# Altium integrated library Integrated_Library - 02.02.25 - 22.49.IntLib: 792 symbols (part 7 of 11)
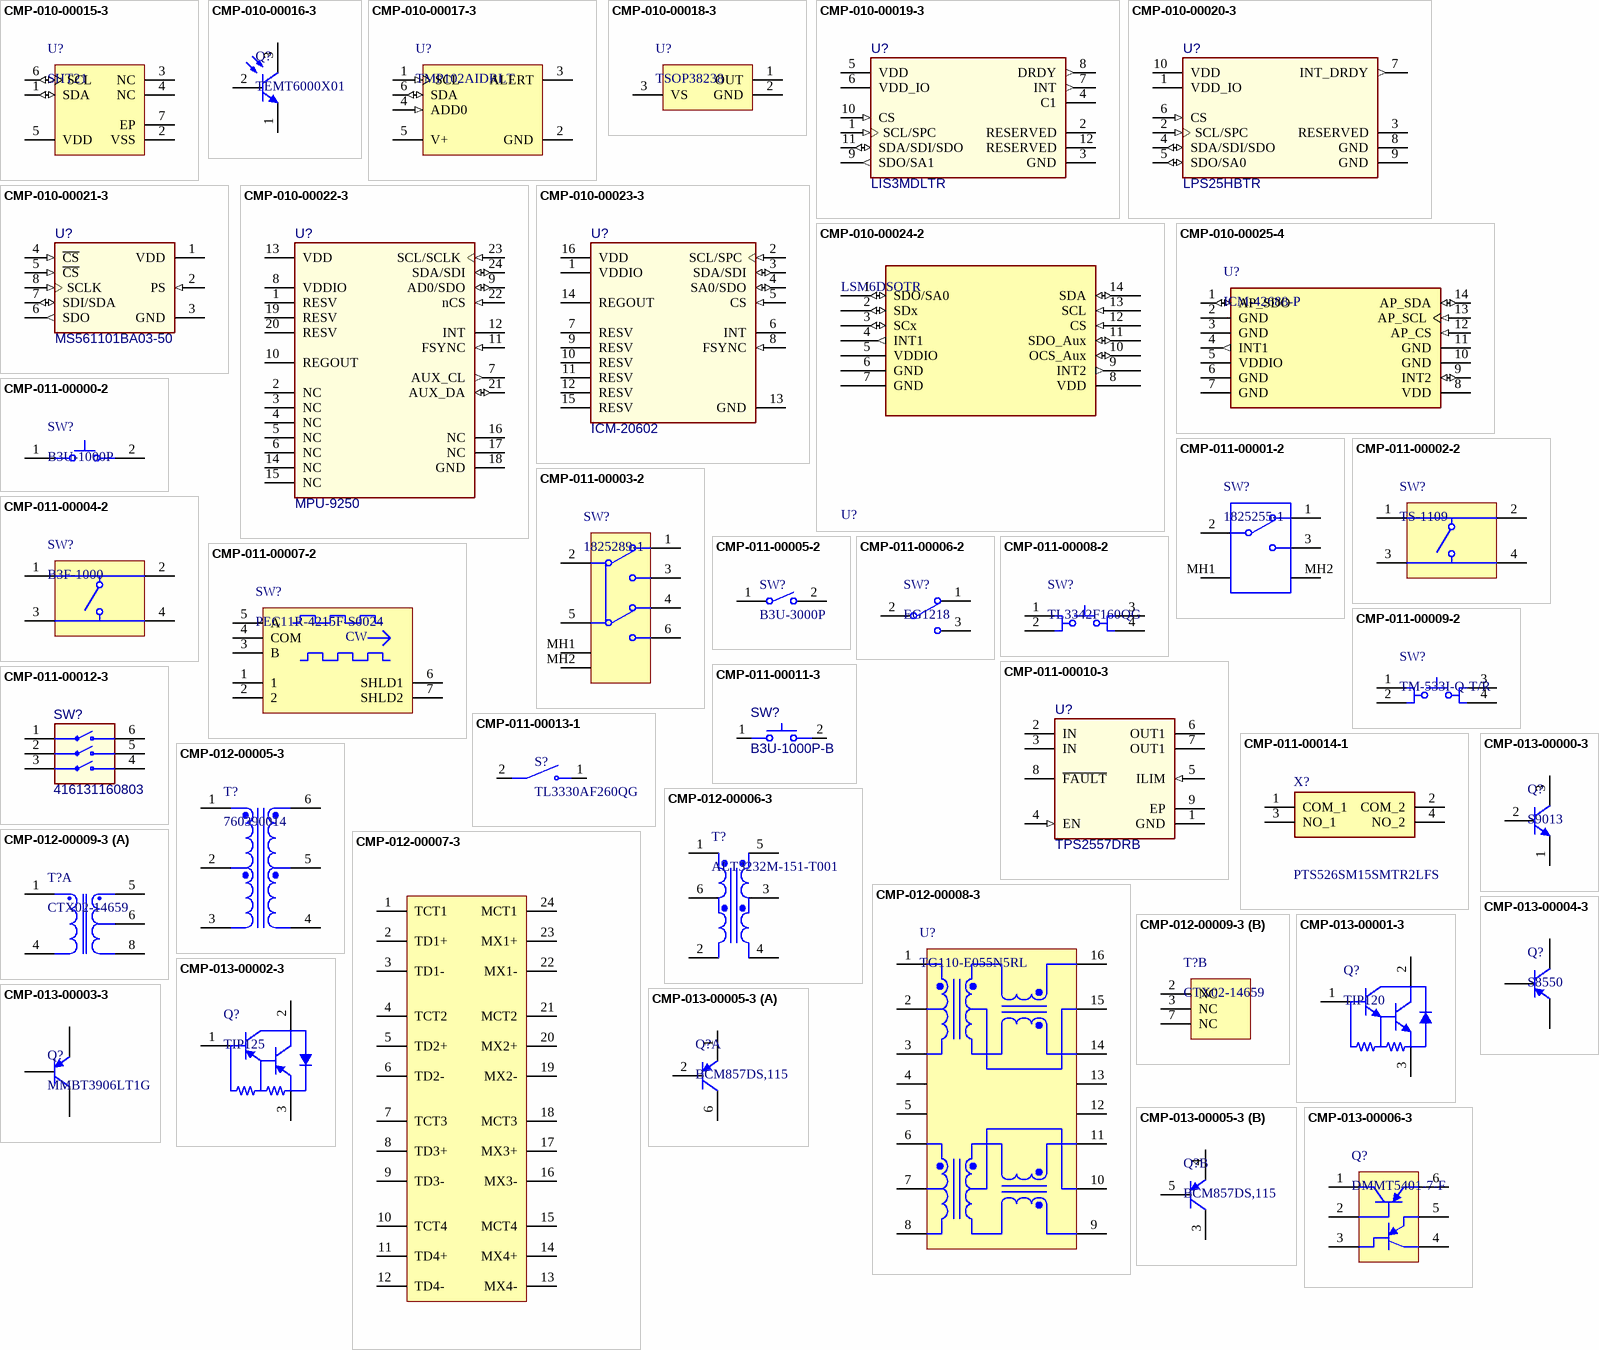
[diagram p32: symbols CMP-010-00015-3 to CMP-013-00006-3]

## CMP-010-00022-3
designator U?, comment MPU-9250
9-axis MotionTracking device, 2.4 to 3,6 V, -40 to 85 degC, 24-Pin QFN, RoHS, Tape and Reel; Min Supply Voltage: 2.4V; Max Supply Voltage: 3.6V; Sensor Type: Accelerometer,Gyroscope,Magnetometer; Pins: 24; Max Operating Temperature: 85°C; Min Operating Temperature: -40°C; Mounting Technology: SMT; Case/Package: QFN
footprint INSE-QFN-24-1700X1540TP_N (QFN, 24-Leads, Body 3.1x3.1mm, Pitch 0.40mm, Thermal Pad 1.54x1.70mm, IPC Medium Density)
footprint INSE-QFN-24-1700X1540TP_N-40 (QFN, 24-Leads, Body 3.1x3.1mm, Pitch 0.40mm, Thermal Pad 1.54x1.70mm, IPC Medium Density)
pins: 1 RESV (power) "Reserved. Connect to VDDIO", 2 NC "Not internally connected. May be used for PCB trace routing", 3 NC "Not internally connected. May be used for PCB trace routing", 4 NC "Not internally connected. May be used for PCB trace routing", 5 NC "Not internally connected. May be used for PCB trace routing", 6 NC "Not internally connected. May be used for PCB trace routing", 7 AUX_CL (out) "I2C Master serial clock, for connecting to external sensors", 8 VDDIO (power) "Digital I/O supply voltage", 9 AD0/SDO (io) "I2C Slave Address LSB (AD0); SPI serial data output (SDO)", 10 REGOUT "Regulator filter capacitor connection", 11 FSYNC (in) "Frame synchronization digital input. Connect to GND if unused", 12 INT (hiz) "Interrupt digital output (totem pole or open-drain)", 13 VDD (power) "Power supply voltage and Digital I/O supply voltage", 14 NC "Not internally connected. May be used for PCB trace routing", 15 NC "Not internally connected. May be used for PCB trace routing", 16 NC "Not internally connected. May be used for PCB trace routing", 17 NC "Not internally connected. May be used for PCB trace routing", 18 GND (power) "Pow er supply ground", 19 RESV "Reserved. Do not connect", 20 RESV (power) "Reserved. Connect to GND", 21 AUX_DA (io) "I2C master serial data, for connecting to external sensors", 22 nCS (in) "Chip select (SPI mode only)", 23 SCL/SCLK (in) "I2C serial clock (SCL); SPI serial clock (SCLK)", 24 SDA/SDI (io) "I2C serial data (SDA); SPI serial data input (SDI)"

## CMP-010-00023-3
designator U?, comment ICM-20602
High Performance 6-Axis MEMS MotionTracking(TM) Device, 1.71 to 3.45 V, -40 to 85 degC, 16-Pin LGA, RoHS; Max Supply Voltage: 3.45V; Sensor Type: 6 Axis,Accelerometer,Gyroscope,Temperature; Min Supply Voltage: 1.71V; Mounting Technology: SMT; Max Operating Temperature: 85°C; Min Operating Temperature: -40°C; Pins: 16; Case/Package: LGA-16; RoHS Compliant: Yes
footprint INSE-I62-16 (LGA, 16-Leads, Body 3x3mm, Pitch 0.5mm)
footprint INSE-I62-16 (LGA, 16-Leads, Body 3x3mm, Pitch 0.5mm)
pins: 1 VDDIO (power) "Digital I/O supply voltage", 2 SCL/SPC (in) "I2C serial clock (SCL); SPI serial clock (SPC)", 3 SDA/SDI (io) "I2C serial data (SDA); SPI serial data input (SDI)", 4 SA0/SDO (io) "I2C slave address LSB (SA0); SPI serial data output (SDO)", 5 CS (in) "Chip select (0 = SPI mode; 1 = I2C mode)", 6 INT (oc) "Interrupt digital output (totem pole or open-drain)", 7 RESV "Reserved. Do not connect.", 8 FSYNC (in) "Synchronization digital input (optional). Connect to GND if unused.", 9 RESV "Reserved. Connect to GND.", 10 RESV "Reserved. Connect to GND.", 11 RESV "Reserved. Connect to GND.", 12 RESV "Reserved. Connect to GND.", 13 GND (power) "Connect to GND", 14 REGOUT "Regulator filter capacitor connection", 15 RESV "Reserved. Connect to GND.", 16 VDD (power) "Power Supply"

## CMP-010-00024-2
designator U?, comment LSM6DSOTR
Analog Circuit, 1 Func, CMOS, PBGA14; Reach SVHC Compliant: Yes; Throw Configuration: ANALOG CIRCUIT; RoHS Compliant: Yes
footprint FP-LGA-14L-DM00249496-MFG
pins: 1 SDO/SA0 (io), 2 SDx (io), 3 SCx (io), 4 INT1 (out), 5 VDDIO (power), 6 GND (power), 7 GND (power), 8 VDD (power), 9 INT2 (out), 10 OCS_Aux (io), 11 SDO_Aux (io), 12 CS (in), 13 SCL (in), 14 SDA (io)

## CMP-010-00025-4
designator U?, comment ICM-42688-P
Accelerometer, Gyroscope, 6 Axis Sensor Output; Value: *; Availability: Unavailable; Pins: 14; Design Item ID: ICM-42688-P; MP: ICM-42688-P; Case/Package: None; Source: ICM-42688-P.SchLib; Component Type: Standard; Price: None
footprint PQFN50P300X250X97-14N
footprint PQFN50P300X250X97-14N
pins: 1 AP_SDO (io), 2 GND (power), 3 GND (power), 4 INT1 (out), 5 VDDIO (power), 6 GND (power), 7 GND (power), 8 VDD (power), 9 INT2 (io), 10 GND (power), 11 GND (power), 12 AP_CS (in), 13 AP_SCL (in), 14 AP_SDA (io)

## CMP-011-00000-2
designator SW?, comment B3U-1000P
Tactile Switch, SPST-NO, 0.05 A, 12 V, -25 to 70 degC, 2-Pin SMD, RoHS, Tape and Reel; Manufacturer: Omron Electronic Components; IP Rating: IP40; Current Rating: 50mA; Max Contact Resistance: 100mohm; Operating Force: 153gf; Throw Configuration: SPST; Resistance: 0.1Ohm; Max Voltage Rating (DC): 12V; Contact Material: Silver; Max Current Rating: 50mA; Datasheet URL: http://www.omron.com/ecb/products/pdf/en-b3u.pdf; Mounting Technology: SM; Case/Package: B3U-1000; Packaging: TapeandReel; Package Reference: B3U-1000; Manufacturer URL: http://www.omron.com/; Datasheet Version: Jan-15; RoHS Compliant: True; Max Operating Temperature: 70°C; Contact Current Rating: 50mA; Package Quantity: 3500; Package Description: 2-Pin Surface Mount Device, Body 3 x 2.5 mm; Voltage Rating (DC): 12V; Min Operating Temperature: -25°C; Voltage Rating: 12V
footprint OMRON-B3U-1000_V (SMD, 2-Leads, Body 3x2.5mm)
pins: 1, 2

## CMP-011-00001-2
designator SW?, comment 1825255-1
Slide Switch, SPDT, 0.3A, 125 V, -20 to 85 degC, 5-Pin THD, RoHS, Tray; Manufacturer: TE Connectivity; Current Rating: 300mA; Voltage Rating (AC): 125V; Max Contact Resistance: 30mohm; Operating Force: 600gf; Manufacturer URL: http://www.te.com/; Max Current Rating: 300mA; Contact Plating: Silver; Contact Material: Copper; Datasheet URL: http://www.te.com/commerce/DocumentDelivery/DDEController?Action=showdoc&DocId=Customer+Drawing%7F1825255%7FA4%7Fpdf%7FEnglish%7FENG_CD_1825255_A4_baseFilename.pdf%7F1825255-1; Throw Configuration: SPDT; Packaging: Bulk; Package Quantity: 560; Max Voltage Rating (AC): 125V; Mounting Technology: TH; RoHS Compliant: True; Case/Package: 1825255-1; Datasheet Version: Rev. A4, 03/2014; Contact Finish: Silver; Package Reference: 1825255-1; Package Description: 5-Pin Through Hole Device, Body 6.7 x 16 mm, Pitch 4 mm; Min Operating Temperature: -20°C; Max Operating Temperature: 85°C
footprint TECO-1825255-1_V (THD, 5-Leads, Body 6.7x16mm, Pitch 4mm)
pins: 1, 2, 3, MH1, MH2

## CMP-011-00002-2
designator SW?, comment TS-1109
Tactile Switch, SPST, 12 V, 50 mA, -20 to 80 degC, 4-Pin THD; Manufacturer: Shenzhen Best; RoHS Compliant: Unknown; Manufacturer URL: www.best-dz.com/; Case/Package: TS-1109; Package Reference: TS-1109; Datasheet Version: Dec-12; Mounting Technology: TH; Package Description: 4-Pin Through Hole Device, Body 6.2 x 6.2 mm; Datasheet URL: http://datasheet.octopart.com/TS-1109-Best-Inc.-datasheet-30458100.pdf
footprint BEST-TS-1109_V (THD, 4-Leads, Body 6.2x6.2mm)
pins: 1, 2, 3, 4

## CMP-011-00003-2
designator SW?, comment 1825289-1
Slide Switch, DPDT, 0.3A, 125 V, -20 to 85 degC, 6-Pin THD, RoHS, Bulk; Manufacturer: TE Connectivity; Max Contact Resistance: 30mohm; Operating Force: 600gf; Voltage Rating (AC): 125V; Max Current Rating: 300mA; Throw Configuration: DPDT; Mounting Technology: TH; Manufacturer URL: http://www.te.com/; Contact Plating: Silver; Datasheet Version: Mar-08; Max Operating Temperature: 85°C; Contact Finish: Silver; Package Reference: 1825289-1; Package Quantity: 560; Min Operating Temperature: -20°C; Max Voltage Rating (AC): 125V; RoHS Compliant: True; Package Description: 6-Pin Through Hole Device, Body 16 x 6.7 mm, Height 12.05 mm; Current Rating: 300mA; Packaging: Bulk; Case/Package: 1825289-1; Contact Material: Copper; Package URL: http://www.te.com/commerce/DocumentDelivery/DDEController?Action=showdoc&DocId=Customer+Drawing%7F1825289%7FB3%7Fpdf%7FEnglish%7FENG_CD_1825289_B3.pdf%7F1825289-1; Datasheet URL: http://www.te.com/commerce/DocumentDelivery/DDEController?Action=showdoc&DocId=Catalog+Section%7F1308111-1_SWITCHES_CORE_PROGRAM_CATALOG%7F0308%7Fpdf%7FEnglish%7FENG_CS_1308111-1_SWITCHES_CORE_PROGRAM_CATALOG_0308.pdf%7F1825289-1
footprint TE-1825289-1_V (TH, 6-Leads, Body 16.05x6.75mm)
pins: 1, 2, 3, 4, 5, 6, MH1, MH2

## CMP-011-00004-2
designator SW?, comment B3F-1000
Tactile Switch, SPST-NO, 0.05 A, 24 V, -25 to 70 degC, 4-Pin THD, RoHS, Bulk; Manufacturer: Omron Electronic Components; Throw Configuration: SPST; Max Contact Resistance: 100mohm; Resistance: 0.1Ohm; Max Current Rating: 50mA; Voltage Rating: 24V; Operating Force: 100gf; Datasheet Version: Jan-15; Case/Package: B3F-1000; Packaging: Bulk; Package Description: 4-Pin Through Hole Device, Body 6 x 6 mm; Manufacturer URL: http://www.omron.com/; Package Reference: B3F-1000; Contact Plating: Gold; Contact Current Rating: 50mA; RoHS Compliant: True; Contact Material: Gold; Mounting Technology: TH; Max Operating Temperature: 70°C; Min Operating Temperature: -25°C; Package Quantity: 1500; Datasheet URL: http://www.omron.com/ecb/products/pdf/en-b3f.pdf; Voltage Rating (DC): 24V; Pins: 4; Current Rating: 50mA; Max Voltage Rating (DC): 24V
footprint OMRON-B3F-1000-4_V (TH, 4-Leads, Body 6x6mm)
pins: 1, 2, 3, 4

## CMP-011-00005-2
designator SW?, comment B3U-3000P
Tactile Switch, SPST-NO, 0.05 A, 12 V, -25 to 70 degC, 2-Pin SMD, RoHS, Tape and Reel; Manufacturer: Omron Electronic Components; Operating Force: 162gf; Voltage Rating (DC): 12V; Current Rating: 50mA; IP Rating: IP40; Throw Configuration: SPST; Max Contact Resistance: 100mohm; RoHS Compliant: True; Contact Current Rating: 50mA; Manufacturer URL: http://www.omron.com/; Packaging: TapeandReel; Max Voltage Rating (DC): 12V; Contact Material: Silver; Datasheet Version: Jan-15; Package Reference: B3U-3000P; Package Description: 2-Pin Surface Mount Device, Body 4 x 3.2 mm; Min Operating Temperature: -25°C; Package Quantity: 4000; Max Operating Temperature: 70°C; Max Current Rating: 50mA; Voltage Rating: 12V; Case/Package: B3U-3000P; Mounting Technology: SM; Datasheet URL: https://www.omron.com/ecb/products/pdf/en-b3u.pdf
footprint OMRON-B3U-3000P_V (SMD, 2-Leads, Body 4x3.2mm)
pins: 1, 2

## CMP-011-00006-2
designator SW?, comment EG1218
Slide Switch, SPDT, 500 V, -20 to 70 degC, 3-Pin THD, RoHS, Bulk; Manufacturer: E-Switch; Voltage Rating (DC): 30V; Current Rating: 200mA; Operating Force: 250gf; Package Quantity: 1000; Contact Plating: Silver; Max Operating Temperature: 70°C; Min Operating Temperature: -20°C; Contact Material: Copper; Datasheet URL: https://www.e-switch.com/system/asset/product_line/data_sheet/119/EG.pdf; Contact Finish: Silver; Case/Package: EG1218; Voltage Rating (AC): 30V; Datasheet Version: Oct-15; Package Description: 3-Pin Through Hole Device, Body 11.6 x 4 mm, Pitch 2.5 mm; RoHS Compliant: True; Package Reference: EG1218; Manufacturer URL: http://www.e-switch.ch/en/; Throw Configuration: SPDT; Contact Current Rating: 200mA; Mounting Technology: TH; Packaging: Bulk; Pins: 3
footprint ESWI-EG1218_V (THD, 3-Leads, Body 11.6x4mm, Pitch 2.5mm)
pins: 1, 2 COM, 3

## CMP-011-00007-2
designator SW?, comment PEC11R-4215F-S0024
12 mm Incremental Encoder, 24 Detent, -30 to 70 degC, 5-Pin THD, RoHS, Bulk; Manufacturer: Bourns; Channels: 2; RoHS Compliant: True; Product Type: Mechanical; Datasheet Version: Jul-14; Package Quantity: 150; Manufacturer URL: http://www.bourns.com/; Case/Package: PEC11R-4XXXF-SXXXX; Packaging: Bulk; Package Reference: PEC11R-4XXXF-SXXXX; Min Operating Temperature: -30°C; Max Operating Temperature: 70°C; Datasheet URL: http://www.bourns.com/docs/Product-Datasheets/PEC11R.pdf; Mounting Technology: TH; Package Description: 5-Pin Through Hole Device, Body 12.5 x 13.4 mm
footprint BOUR-PEC11R-4XXXF-SXXXX_V (THD, 5-Leads, Body 12.5x13.4mm)
pins: 1, 2, 3 B "Channel B", 4 COM "Common", 5 A "Channel A", 6 SHLD1, 7 SHLD2
text: CW

## CMP-011-00008-2
designator SW?, comment TL3342F160QG
Tactile Switch, SPST-NO, 50 mA, 12 V, 4-Pin SMD, RoHS, Tape and Reel; Manufacturer: E-Switch; Operating Force: 1.6N; Current Rating: 50mA; Throw Configuration: SPST; Max Voltage Rating (DC): 12V; Datasheet URL: http://spec_sheets.e-switch.com/specs/P010632.pdf; Manufacturer URL: http://www.e-switch.ch/en/; Mounting Technology: SM; Case/Package: TL3342F160QG; Package Quantity: 3000; Contact Material: Silver; Package Description: 4-Pin Surface Mount Device, Body 5 x 5 mm, Pitch 6.3 mm; Package Reference: TL3342F160QG; Datasheet Version: Rev. I, 12/2010; Voltage Rating (DC): 12V; Contact Plating: Silver; RoHS Compliant: True; Packaging: TapeandReel
footprint ESWI-TL3342F160QG_V (SMD, 4-Leads, Body 5x5mm, Pitch 6.3mm)
pins: 1, 2, 3, 4

## CMP-011-00009-2
designator SW?, comment TM-533I-Q-T/R
Tactile Switch, SPNO, -25 to 70 degC, 4-Pin SMD, RoHS, Tape and Reel; Manufacturer: Multicomp; Operating Force: 160gf; Max Contact Resistance: 100mohm; Resistance: 0.1Ohm; Package Reference: TM-533I-Q-T/R; Mounting Technology: SM; Min Operating Temperature: -25°C; Max Operating Temperature: 70°C; RoHS Compliant: True; Package Description: 4-Pin Surface Mount Device, Body 5.2 x 5.2 mm; Case/Package: TM-533I-Q-T/R; Datasheet URL: http://www.micropik.com/PDF/pul5x5.pdf; Datasheet Version: Rev. 1.1, 12/2011
footprint MULT-TM-533I-Q_V (SMD, 4-Leads, Body 5.2x5.2mm)
pins: 1, 2, 3, 4

## CMP-011-00010-3
designator U?, comment TPS2557DRB
Precision Adjustable Current-Limited Power-Distribution Switch, 0.5 to 5.0 A Current Limit, -40 to 85 degC, 8-pin SON (DRB), Green (RoHS & no Sb/Br); ComponentLink1Description: Datasheet; ComponentLink1URL: http://www.ti.com/general/docs/lit/getliterature.tsp?genericPartNumber=TPS2557&fileType=pdf; Mounting Technology: Surface Mount; Pins: 9; Case/Package: 8-Pin Plastic Small Outline No-Lead, 3 x 3 x 1 mm Body, 0.65 mm Pitch, Exposed Pad
footprint DRB0008B_V (SON, 8-Leads, Body 3x3mm, Pitch 0.65mm, Thermal Pad 2.4x1.65mm, TI Recommended)
footprint DRB0008B_V (SON, 8-Leads, Body 3x3mm, Pitch 0.65mm, Thermal Pad 2.4x1.65mm, TI Recommended)
pins: 1 GND (power) "Ground connection; connect externally to PowerPAD", 2 IN (power) "Input voltage; connect a 0.1 uF or greater ceramic capacitor from IN to GND as close to the IC as possible.", 3 IN (power) "Input voltage; connect a 0.1 uF or greater ceramic capacitor from IN to GND as close to the IC as possible.", 4 EN (in) "Enable input, logic high turns on power switch", 5 ILIM (in) "External resistor used to set current-limit threshold; recommended 20 k ohm =< RILIM =< 187 k ohm", 6 OUT1 (power) "Power-switch output", 7 OUT1 (power) "Power-switch output", 8 ~{FAULT} (hiz) "Active-low open-drain output, asserted during overcurrent or overtemperature conditions.", 9 EP (power) "Internally connected to GND; used to heat-sink the part to the circuit board traces. Connect PowerPAD to GND pin externally."

## CMP-011-00011-3
designator SW?, comment B3U-1000P-B
Ultra-small Surface-mounting Tactile Switches with High Contact Reliability, SPST-NO, -25 to 70 degC, 2-Pin SMD, RoHS, Tape and Reel; Voltage Rating: 12V; Current Rating: 50mA; Pins: 2; RoHS Compliant: Details
footprint OMRON-B3U-1000P-2-B_V (SMT, 2-Leads, Body 3x2.5mm)
footprint OMRON-B3U-1000P-2-B_V (SMT, 2-Leads, Body 3x2.5mm)
pins: 1, 2

## CMP-011-00012-3
designator SW?, comment 416131160803
WS-DISV 1.27 mm small compact SMD Dip Switch with top tape; ComponentLink1Description: Manufacturer URL; ComponentLink2Description: Datasheet; ComponentLink2URL: http://katalog.we-online.de/em/datasheet/4161311608xx.pdf; Pins: 6; ComponentLink1URL: http://www.we-online.com
footprint 416131160803 (03p, 1.27mm Pitch, Horizontal, HP Type, SMT, flat Actuator, black, with Tape, T&R)
footprint 416131160803 (03p, 1.27mm Pitch, Horizontal, HP Type, SMT, flat Actuator, black, with Tape, T&R)
pins: 1, 2, 3, 4, 5, 6

## CMP-011-00013-1
designator S?, comment TL3330AF260QG
Tactile Switch SPST-NO Side Actuated Surface Mount, Right Angle; MF: E-Switch; SnapEDA_Link: https://www.snapeda.com/parts/TL3330AF260QG/E-Switch/view-part/?ref=snap; Source: TL3330AF260QG.SchLib; Pins: 2; Value: *; Price: None; Check_prices: https://www.snapeda.com/parts/TL3330AF260QG/E-Switch/view-part/?ref=eda; MP: TL3330AF260QG; Design Item ID: TL3330AF260QG; Case/Package: None; Component Type: Standard; Purchase-URL: https://pricing.snapeda.com/search/part/TL3330AF260QG/?ref=eda; Availability: In Stock
footprint SW_TL3330AF260QG
footprint SW_TL3330AF260QG
pins: 1, 2

## CMP-011-00014-1
designator X?, comment PTS526SM15SMTR2LFS
Switch Tactile N.O. SPST Round Button Gull Wing 0.05A 12VDC 500000Cycles 1.57N SMD T/R
footprint PTS526SM15SMTR2LFS
footprint PTS526SM15SMTR2LFS
pins: 1 COM_1, 2 COM_2, 3 NO_1, 4 NO_2

## CMP-012-00005-3
designator T?, comment 760390014
Audio & Signal Transformer, 475 uH, -40 to 125 degC, 6-Pin SMD, RoHS, Tape and Reel; Manufacturer: Wuerth Elektronik; Inductance: 475uH; Mounting Technology: SurfaceMount; Datasheet URL: https://datasheet.ciiva.com/12335/760390014-221199-12335395.pdf; Package Reference: 760390014; Package Description: 6-Pin Surface Mounted Device, Body 7.14 x 6.73 mm, Pitch 2.54 mm; Min Operating Temperature: -40°C; RoHS Compliant: True; Max Operating Temperature: 125°C; Pins: 6; Case/Package: SMD; Datasheet Version: Rev. 6C, 06/2013
footprint WE-760390014-6_V (SMD, 6-Leads, Body 7.14x6.73mm, Pitch 2.54mm)
pins: 1, 2, 3, 4, 5, 6

## CMP-012-00006-3
designator T?, comment ALT3232M-151-T001
Pulse Transformer for LAN Interface, 2.5 dB, -40 to 85 degC, 6-Pin SMD, RoHS, Tape and Reel; Manufacturer: TDK; Inductance: 150uH; Insertion Loss: 2.5dB; Datasheet URL: https://product.tdk.com/info/en/catalog/datasheets/trans_alt_en.pdf; Package Reference: ALT3232; RoHS Compliant: True; Min Operating Temperature: -40°C; Case/Package: SMD; Package Description: 6-Pin Surface Mount Device, Body 3.2 x 3.2 mm; Max Operating Temperature: 80°C; Datasheet Version: May-16; Pins: 6; Mounting Technology: SurfaceMount
footprint TDK-ALT3232_V (SMD, 6-Leads, Body 3.2x3.2mm)
pins: 1, 2, 3, 4, 5, 6

## CMP-012-00007-3
designator U?, comment HX5008NL
Telecom Transformer 1:1 24Term, 0 to 70 degC, 24-Pin SMD, RoHS, Rail/Tube; Manufacturer: Pulse Electronics; SymbolCreator: Altium; Insertion Loss: 1dB; Return Loss: -10dB; SymbolVersion: 2014-09-23; Max Operating Temperature: 80°C; Package Description: 24-Pin Surface Mount Device, Body 15.11 x 13.16 mm, Pitch 0.99 mm; Datasheet URL: http://www.mouser.com/ds/2/336/-515483.pdf; Mounting Technology: SurfaceMount; Min Operating Temperature: -40°C; Package Reference: HX5008NL; Datasheet Version: Rev. A, 07/2015; Case/Package: SOP; Pins: 24; RoHS Compliant: True
footprint PULS-HX5008NL_V (SOP, 24-Leads, Body 15.1x13.2mm, Pitch 0.99mm)
pins: 1 TCT1, 2 TD1+, 3 TD1-, 4 TCT2, 5 TD2+, 6 TD2-, 7 TCT3, 8 TD3+, 9 TD3-, 10 TCT4, 11 TD4+, 12 TD4-, 13 MX4-, 14 MX4+, 15 MCT4, 16 MX3-, 17 MX3+, 18 MCT3, 19 MX2-, 20 MX2+, 21 MCT2, 22 MX1-, 23 MX1+, 24 MCT1

## CMP-012-00008-3
designator U?, comment TG110-E055N5RL
Single Port 10/100BASE-TX Transformer, -40 to 85 degC, 16-Pin SMD (N5), RoHS; Manufacturer: HALO Electronics; Inductance: 0.4uH; DCR: 1Ohm; Case/Package: Module; Mounting Technology: SurfaceMount; Package Reference: N5-16; Datasheet URL: http://download.siliconexpert.com/pdfs/2015/10/26/2/23/53/15/halo_/manual/1904914511853938ultra.pdf; Package Description: 16-Pin Surface Mount Device, Body 12.7 x 7.11 mm, Pitch 1.27 mm; Datasheet Version: Aug-15; Min Operating Temperature: -40°C; Pins: 16; RoHS Compliant: True; Max Operating Temperature: 80°C
footprint HLE-N5-16_V (SMD, 16-Leads, Body 12.7x7.11mm, Pitch 1.27mm)
pins: 1, 2, 3, 4, 5, 6, 7, 8, 9, 10, 11, 12, 13, 14, 15, 16

## CMP-012-00009-3
designator T?, comment CTX02-14659
Transformer Push-Pull, 547 uH, ER 9.5, 8-Pin SMT, RoHS, Tape and Reel; Manufacturer: EATON; RoHS Compliant: True; Package Description: 8-Pin Surface Mount Technology, Body 10 x 8.1 mm, Pitch 2 mm; Case/Package: SMD; Pins: 8; Datasheet URL: https://datasheet.ciiva.com/36178/1771317-36178918.pdf; Datasheet Version: Rev. H, 09/2006; Mounting Technology: SurfaceMount; Package Reference: CTX02-14659
footprint EATN-CTX02-14659_V (SMT, 8-Leads, Body 10x8.1mm, Pitch 2mm)
part A pins: 1, 4, 5, 6, 8
part B pins: 2 NC, 3 NC, 7 NC

## CMP-013-00000-3
designator Q?, comment S9013
Transistor, NPN, 0.1 uA, 150 MHz, 3-Pin TO-92; Manufacturer: Jiangsu Changjiang Electronics Technology; Case/Package: TO-92-3; Datasheet URL: http://www.cj-elec.com/txUpfile/20121910315050632.pdf; Datasheet Version: Rev. B, 11/2011; Package Description: 3-Pin Through Hole Device, Height 4.7 mm, Pitch 2.3 mm; Mounting Technology: TH; RoHS Compliant: False; Package Reference: TO-92-3
footprint JSCJ-TO-92-3_V (TO-92, 3-leads, Height 4.7mm, Pitch 1.27mm)
pins: 1 E, 2 B, 3 C

## CMP-013-00001-3
designator Q?, comment TIP120
Plastic Medium-Power Complementary Silicon Transistor, 60 V VCEO, -65 to 150 degC, 3-Pin TO-220, RoHS, Tube; Manufacturer: ON Semiconductor; hFE Min: 1000; Package Version: Rev. AH, 08/2014; Vce Max: 4V; Package Quantity: 50; Pins: 3; Min Operating Temperature: -65°C; Datasheet Version: Rev. 9, 11/2014; Mounting Technology: TH; Package Description: 3-Pin Flange Mount, Vertical Straight Lead, Body 10.095 x 4.45 mm, Pitch 2.54 mm; Case/Package: TO-220-3; RoHS Compliant: True; Datasheet URL: http://www.onsemi.cn/pub_link/Collateral/TIP120-D.PDF; Packaging: Rail/Tube; Max Operating Temperature: 150°C; Package Reference: TO-220-3-221A-09
footprint ONSC-TO-220-3-221A-09 (FM, 3-Leads, Body 10.55x4.85mm, Pitch 2.54mm)
pins: 1 B, 2 C, 3 E

## CMP-013-00002-3
designator Q?, comment TIP125
Plastic Medium-Power Complementary Silicon Transistor, 60 V VCEO, -65 to 150 degC, 3-Pin TO-220, RoHS, Tube; Manufacturer: ON Semiconductor; hFE Min: 1000; Package Version: Rev. AH, 08/2014; Vce Max: 4V; Package Quantity: 50; Mounting Technology: TH; Pins: 3; Min Operating Temperature: -65°C; Case/Package: TO-220-3; Package Description: 3-Pin Flange Mount, Vertical Straight Lead, Body 10.095 x 4.45 mm, Pitch 2.54 mm; Packaging: Rail/Tube; Package Reference: TO-220-3-221A-09; Max Operating Temperature: 150°C; RoHS Compliant: True; Datasheet URL: http://www.onsemi.cn/pub_link/Collateral/TIP120-D.PDF; Datasheet Version: Rev. 9, 11/2014
footprint ONSC-TO-220-3-221A-09 (FM, 3-Leads, Body 10.55x4.85mm, Pitch 2.54mm)
pins: 1 B, 2 C, 3 E

## CMP-013-00003-3
designator Q?, comment MMBT3906LT1G
PNP General-Purpose Amplifier, 40 V, 0.2 A, -55 to 150 degC, 3-Pin SOT23, RoHS, Tape and Reel; Manufacturer: ON Semiconductor; Power: 225mW; Frequency: 250MHz; hFE Min: 80; Vce Max: 400mV; Elements: 1; Packaging: TapeandReel; Max Operating Temperature: 150°C; Datasheet URL: http://www.onsemi.cn/pub_link/Collateral/MMBT3906LT1-D.PDF; Pins: 3; Package Quantity: 3000; Package Description: 3-Pin Small Outline Transistor, Body 2.9 x 1.3 mm, Pitch 0.95 mm; Mounting Technology: SM; Datasheet Version: Rev. 12, 10/2016; Package Reference: SOT-23 (318-08); RoHS Compliant: True; Min Operating Temperature: -55°C; Case/Package: TO-236-3
footprint ONSC-SOT-23-3-318-08_V (SOT23, 3-Leads, Body 3.04x1.4mm, Pitch 0.95mm)
pins: 1 B, 2 E, 3 C

## CMP-013-00004-3
designator Q?, comment S8550
Low Voltage High Current Small Signal PNP Transistor, 20 V, 700 mA, 3-Pin TO-92, RoHS; Manufacturer: Unisonic; Mounting Technology: TH; Package Description: 3-Pin Through Hole Device, Dia 4.58 mm, Pitch 1.27 mm; Datasheet URL: http://media.nkcelectronics.com/datasheet/s8550.pdf; Case/Package: TO-92-3; Datasheet Version: Rev. E, 06/2014; Package Reference: TO-92-3; RoHS Compliant: Unknown
footprint UNIC-TO-92-3 (TO-92, 3-Leads, Dia 4.58mm, Pitch 1.27mm)
pins: 1 E, 2 B, 3 C

## CMP-013-00005-3
designator Q?, comment BCM857DS,115
PNP/PNP Matched Double Transistors, 175 MHz, -65 to 150 degC, 6-Pin SOT457, RoHS, Tape and Reel; Manufacturer: NXP; Power: 380mW; Package Version: Feb-16; Vce Max: 400mV; hFE Min: 200; Tolerance: 5%; Frequency: 175MHz; Packaging: TapeandReel; Package Description: 6-Pin Small Outline Transistor, Body 2.9 x 1.5 mm, Pitch 0.95 mm; Max Operating Temperature: 150°C; Mounting Technology: SM; Case/Package: SOT-457; Pins: 6; Min Operating Temperature: -65°C; RoHS Compliant: True; Datasheet URL: http://cache.nxp.com/documents/data_sheet/BCM857BV_BS_DS.pdf?pspll=1; Datasheet Version: Rev. 06, 08/2009; Package Reference: SOT457-6; Package Quantity: 3000
footprint NXP-SOT457-6_V (SOT457, 6-Leads, Body 3.1x1.7mm, Pitch 0.95mm)
part A pins: 1 E1 "emitter TR1", 2 B1 "base TR1", 6 C1 "collector TR1"
part B pins: 3 C2 "collector TR2", 4 E2 "emitter TR2", 5 B2 "base TR2"

## CMP-013-00006-3
designator Q?, comment DMMT5401-7-F
Matched PNP Small Signal Surface Mount Transistor, 300 mW, -55 to 150 degC, 6-Pin SOT-26, RoHS, Tape and Reel; Manufacturer: Diodes Inc; Frequency: 300MHz; hFE Min: 60; Power: 300mW; Vce Max: 500mV; Elements: 2; Mounting Technology: SM; Package Quantity: 3000; Package Reference: SOT-26-6; Datasheet URL: http://www.diodes.com/_files/datasheets/ds30437.pdf; Min Operating Temperature: -55°C; Datasheet Version: Rev. 6-2, 05/2009; Pins: 6; Package Description: 6-Pin Small Outline Transistor, Body 1.6 x 3 mm, Pitch 0.95 mm; RoHS Compliant: True; Max Operating Temperature: 150°C; Case/Package: SOT-26; Packaging: TapeandReel
footprint DIOD-SOT-26-6_M (SOT23, 6-Leads, Body 3.1x1.7mm, Pitch 0.95mm, IPC Low Density)
footprint DIOD-SOT-26-6_L (SOT23, 6-Leads, Body 3.1x1.7mm, Pitch 0.95mm, IPC High Density)
footprint DIOD-SOT-26-6_N (SOT23, 6-Leads, Body 3.1x1.7mm, Pitch 0.95mm, IPC Medium Density)
pins: 1 C1, 2 B1, 3 B2, 4 C2, 5 E2, 6 E1

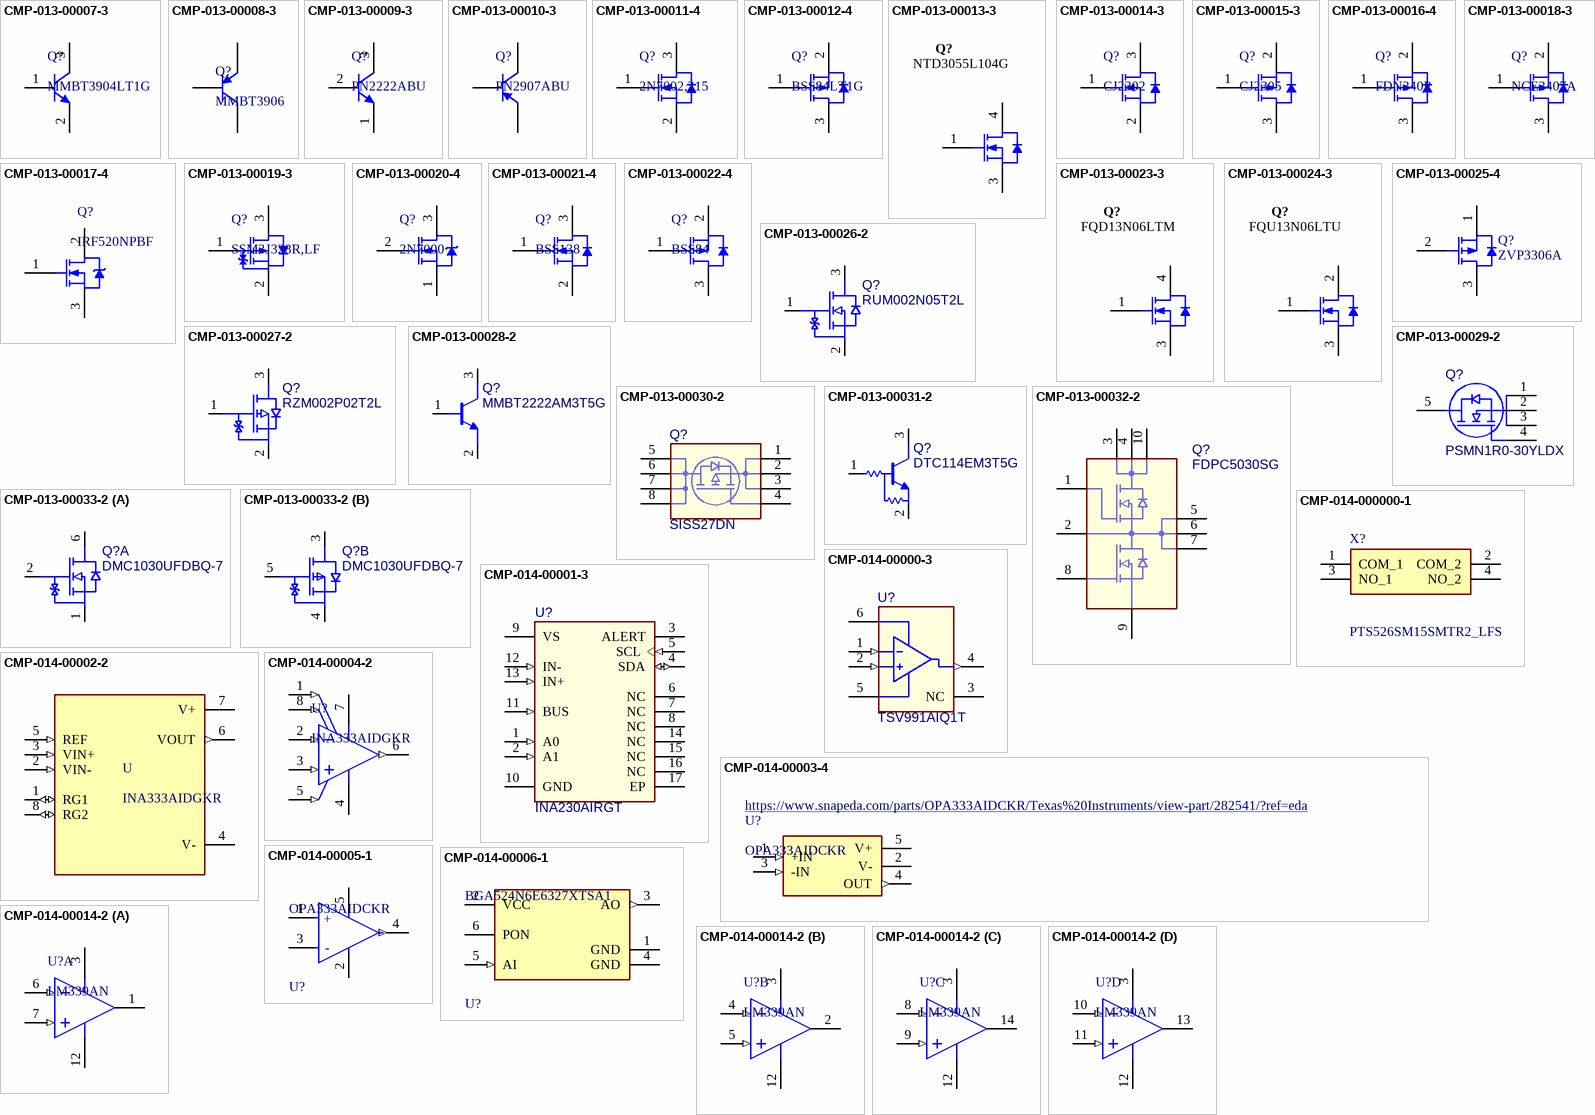
[diagram p16: symbols CMP-013-00007-3 to CMP-014-00014-2]

## CMP-013-00007-3
designator Q?, comment MMBT3904LT1G
General Purpose Transistor, NPN Silicon, 40 V, 0.2 A, -55 to 150 degC, 3-Pin SOT23, RoHS, Tape and Reel; Manufacturer: ON Semiconductor; Elements: 1; Power: 225mW; Frequency: 300MHz; hFE Min: 80; Vce Max: 300mV; Mounting Technology: SM; Min Operating Temperature: -55°C; Datasheet URL: http://www.onsemi.cn/pub_link/Collateral/MMBT3904LT1-D.PDF; Pins: 3; Package Description: 3-Pin Small Outline Transistor, Body 2.9 x 1.3 mm, Pitch 0.95 mm; Max Operating Temperature: 150°C; Package Reference: SOT-23 (318-08); Package Quantity: 3000; RoHS Compliant: True; Packaging: TapeandReel; Datasheet Version: Rev. 12, 11/2012; Case/Package: TO-236-3
footprint ONSC-SOT-23-3-318-08_V (SOT23, 3-Leads, Body 3.04x1.4mm, Pitch 0.95mm)
pins: 1 B, 2 E, 3 C

## CMP-013-00008-3
designator Q?, comment MMBT3906
PNP General-Purpose Amplifier, 40 V, 0.2 A, -55 to 150 degC, 3-Pin SOT23, RoHS, Tape and Reel; Manufacturer: Fairchild; Power: 350mW; Elements: 1; Vce Max: 400mV; Package Version: Rev. 12, 03/2016; hFE Min: 100; Frequency: 250MHz; Package Reference: SOT23-3; Mounting Technology: SM; Datasheet URL: https://www.fairchildsemi.com/datasheets/MM/MMBT3906.pdf; RoHS Compliant: True; Min Operating Temperature: -55°C; Packaging: TapeandReel; Max Operating Temperature: 150°C; Datasheet Version: Rev. 1.2.2, 04/2014; Package Description: 3-Pin Small Outline Transistor, Body 2.92 x 1.325 mm, Pitch 0.95 mm; Package Quantity: 3000; Pins: 3; Case/Package: TO-236-3
footprint FAIR-SOT23-3_V (SOT23, 3-Leads, Body 3.12x1.5mm, Pitch 0.95mm)
pins: 1 B, 2 E, 3 C

## CMP-013-00009-3
designator Q?, comment PN2222ABU
NPN General-Purpose Amplifier, 40 V, -55 to 150 degC, 3-Pin TO-92, RoHS, Bulk; Manufacturer: Fairchild; Power: 625mW; Elements: 1; hFE Min: 100; Vce Max: 1V; Frequency: 300MHz; Mounting Technology: TH; Package Quantity: 1000; RoHS Compliant: True; Datasheet Version: Rev. 1.1.0, 07/2014; Max Operating Temperature: 150°C; Min Operating Temperature: -55°C; Package Reference: TO-92; Package Description: 3-Pin Transistor Outline Package, Body Dia 4.79 mm, Pitch 1.27 mm; Pins: 3; Packaging: Bulk; Datasheet URL: https://www.fairchildsemi.com/datasheets/PN/PN2222A.pdf; Case/Package: TO-226-3
footprint FAIR-TO-92 (TO, 3-Leads, Body Dia 4.79mm, Pitch 1.27mm)
pins: 1 E, 2 B, 3 C

## CMP-013-00010-3
designator Q?, comment PN2907ABU
BJT PNP General Purpose Transistor, 60 V, 800 mA, -55 to 150 degC, 3-Pin TO-92, RoHS, Bulk; Manufacturer: Fairchild Semiconductor; Frequency: 200MHz; Power: 625mW; Vce Max: 1.6V; hFE Min: 100; Elements: 1; Package Quantity: 1000; Datasheet URL: http://datasheet.octopart.com/PN2907ABU-Fairchild-Semiconductor-datasheet-22973435.pdf; Datasheet Version: Rev. 1.1.2, 01/2014; Package Reference: TO-92; RoHS Compliant: True; Mounting Technology: TH; Max Operating Temperature: 150°C; Case/Package: TO-226-3; Min Operating Temperature: -55°C; Package Description: 3-Pin Transistor Outline Package, Body Dia 4.79 mm, Pitch 1.27 mm; Packaging: Bulk; Pins: 3
footprint FAIR-TO-92 (TO, 3-Leads, Body Dia 4.79mm, Pitch 1.27mm)
pins: 1 E, 2 B, 3 C

## CMP-013-00011-4
designator Q?, comment 2N7002,215
N-channel Trench MOSFET, 60 V, 300 mA, -65 to 150 degC, 3-Pin SOT-23 (TO-236AB), RoHS, Tape and Reel; Manufacturer: NXP Semiconductors; Elements: 1; Power: 830mW; Max Dual Supply Voltage: 60V; Rds On Max: 5Ohm; Package Version: Feb-16; Nominal Vgs: 2V; Input Capacitance: 50pF; RoHS Compliant: True; Datasheet URL: http://www.nxp.com/documents/data_sheet/2N7002.pdf; Packaging: TapeandReel; Case/Package: TO-236-3; Package Reference: SOT23-3; Max Operating Temperature: 150°C; Pins: 8; Mounting Technology: SM; Package Quantity: 1; Datasheet Version: Rev. 7, 09/2011; Nominal Dual Supply Voltage: 60V; Min Operating Temperature: -65°C; Package Description: 3-Pin Small Outline Transistor, Body 1.3 x 2.9 mm, Pitch 0.95 mm; Vds Max: 60V
footprint NXP-SOT23-3_V (SOT23, 3-Leads, Body 2.9x1.3mm, Pitch 0.95mm)
pins: 1 G, 2 S, 3 D

## CMP-013-00012-4
designator Q?, comment BSS84LT1G
Power MOSFET Single P-Channel, -50 V, 10 Ohm, 3-Pin SOT-23, Pb-Free, Tape and Reel; Manufacturer: ON Semiconductor; Elements: 1; Power: 225mW; Nominal Vgs: -10V; Nominal Dual Supply Voltage: 5V; Typical Rise Time: 1ns; Input Capacitance: 30pF; Rds On Max: 10Ohm; RoHS Compliant: True; Mounting Technology: SM; Package Quantity: 3000; Min Operating Temperature: -55°C; Case/Package: SOT-23-3; Packaging: TapeandReel; Package Description: 3-Pin Small Outline Transistor, Body 2.9 x 1.3 mm, Pitch 0.95 mm; Datasheet Version: Rev. 9, 10/2016; Pins: 3; Datasheet URL: http://www.onsemi.com/pub_link/Collateral/BSS84LT1-D.PDF; Max Operating Temperature: 150°C; Package Reference: SOT-23 (318-08)
footprint ONSC-SOT-23-3-318-08_V (SOT23, 3-Leads, Body 3.04x1.4mm, Pitch 0.95mm)
pins: 1 GATE, 2 SOURCE, 3 DRAIN

## CMP-013-00013-3
designator Q?, comment NTD3055L104G
Logic Level N-Channel Power MOSFET, 12 A, 60 V, -55 to 175 degC, 3-Pin DPAK, Pb-Free, Tube; Manufacturer: ON Semiconductor; Typical Rise Time: 104ns; Power: 48W; Input Capacitance: 440pF; Elements: 1; Rds On Max: 104mohm; Pins: 3; Datasheet URL: http://www.onsemi.cn/pub_link/Collateral/NTD3055L104-D.PDF; Datasheet Version: Rev. 10, 09/2016; Min Operating Temperature: -55°C; Package Quantity: 75; Mounting Technology: SM; Package Description: 3-Pin Transistor Outline, Body 6.54 x 6.095 mm, Pitch 2.29 mm; RoHS Compliant: True; Max Operating Temperature: 175°C; Packaging: Rail/Tube; Package Reference: DPAK-3-369C; Case/Package: DPAK
footprint ONSC-DPAK-3-369C_V (DPAK, 3-Leads, Body 6.22x6.75mm, Pitch 2.29mm)
pins: 1 G, 3 S, 4 D

## CMP-013-00014-3
designator Q?, comment CJ2302
N-Channe Plastic Encapsulate MOSFET, 20 V, 2.1 A, 3-Pin SOT23, Tape and Reel; Manufacturer: Jiangsu Changjiang Electronics Technology; Package Version: Rev. E, 09/2009; Package Reference: SOT23-3; Mounting Technology: SM; Datasheet Version: Rev. D, 08/2015; RoHS Compliant: Unknown; Package Description: 3-Pin Small Outline Transistor, Body 2.9 x 1.3 mm, Pitch 0.95 mm; Datasheet URL: http://www.cj-elec.com/gallery/txUpfile/9c19fa03e8d43801a6647d386a41a240.pdf; Case/Package: SOT23-3
footprint JSCJ-SOT23-3_V (SOT23, 3-Leads, Body 3x1.4mm, Pitch 0.95mm)
pins: 1 G, 2 S, 3 D

## CMP-013-00015-3
designator Q?, comment CJ2305
P-Channel Plastic Encapsulate MOSFET, 12 V, 4.1 A, 3-Pin SOT23, Tape and Reel; Manufacturer: Jiangsu Changjiang Electronics Technology; Package Version: Rev. E, 09/2009; Datasheet URL: http://www.cj-elec.com/gallery/txUpfile/5140ba9ed47d18467ea4bddc055cd747.pdf; Case/Package: SOT23-3; Mounting Technology: SM; RoHS Compliant: Unknown; Datasheet Version: Rev. F, 04/2015; Package Description: 3-Pin Small Outline Transistor, Body 2.9 x 1.3 mm, Pitch 0.95 mm; Package Reference: SOT23-3
footprint JSCJ-SOT23-3_V (SOT23, 3-Leads, Body 3x1.4mm, Pitch 0.95mm)
pins: 1 GATE, 2 SOURCE, 3 DRAIN

## CMP-013-00016-4
designator Q?, comment FDN340P
Single P-Channel, Logic Level, PowerTrench(R) MOSFET, 2 A, 20 V, -55 to 150 degC, 3-Pin SOT-23, RoHS, Tape and Reel; Manufacturer: Fairchild Semiconductor; Package Version: Rev. 3, 05/2015; Nominal Vgs: -800mV; Power: 500mW; Nominal Dual Supply Voltage: -20V; Typical Rise Time: 9ns; Elements: 1; Rds On Max: 70mohm; Input Capacitance: 779pF; Package Reference: SSOT3L; Min Operating Temperature: -55°C; RoHS Compliant: True; Package Description: 3-Pin Small Outline Transistor, Body 2.92 x 1.4 mm, Pitch 0.95 mm; Pins: 3; Datasheet Version: Rev. E1, 02/2007; Mounting Technology: SM; Package Quantity: 3000; Packaging: TapeandReel; Max Operating Temperature: 150°C; Datasheet URL: https://www.fairchildsemi.com/datasheets/FD/FDN340P.pdf; Case/Package: TO-236-3
footprint FAIR-SSOT3L-3_V (SOT23, 3-Leads, Body 2.92x1.4mm, Pitch 0.95mm)
pins: 1 GATE, 2 SOURCE, 3 DRAIN

## CMP-013-00017-4
designator Q?, comment IRF520NPBF
HEXFET(R) Power MOSFET, 100 V, 9.7 A, 0.2 Ohm, -55 to 175 degC, 3-Pin FM (TO-220AB), RoHS, Tube; Manufacturer: International Rectifier; Power: 48W; Elements: 1; Typical Rise Time: 23ns; Nominal Dual Supply Voltage: 100V; Rds On Max: 200mohm; Input Capacitance: 330pF; Nominal Vgs: 4V; Package Reference: TO-220AB; Max Operating Temperature: 175°C; Datasheet Version: Nov-03; Datasheet URL: http://www.infineon.com/dgdl/irf520npbf.pdf?fileId=5546d462533600a4015355e340711985; Package Quantity: 50; Package Description: 3-Pin Flange Mount, Body 4.445 x 10.415 mm, Pitch 2.54 mm; Pins: 3; Packaging: Rail/Tube; RoHS Compliant: True; Min Operating Temperature: -55°C; Case/Package: TO-220-3; Mounting Technology: TH
footprint INTR-TO-220AB-3 (FM, 3-Leads, Body 10.55x4.7mm, Pitch 2.54mm)
pins: 1 G, 2 D, 3 S

## CMP-013-00018-3
designator Q?, comment NCE3407A
P-Channel Enhancement Mode Power MOSFET, 30 V, 4.3 A, - 55 to 150 degC, 3-Pin SOT23, RoHS, Tape and Reel; Manufacturer: NCE Power; Datasheet Version: Rev. 1.1, 07/2014; Case/Package: SOT23-3; Mounting Technology: SM; Datasheet URL: http://www.ncepower.com/Upload/MOSFET/mos1/55vpmos/NCE3407Adatasheet-17275285683.pdf; Package Reference: SOT23-3; Package Description: 3-Pin Small Outline Transistor, Body 2.9 x 1.3 mm, Pitch 0.95 mm; RoHS Compliant: Unknown
footprint NCEP-SOT23-3_N (SOT23, 3-Leads, Body 3x1.4mm, Pitch 0.95mm, IPC Medium Density)
footprint NCEP-SOT23-3_M (SOT23, 3-Leads, Body 3x1.4mm, Pitch 0.95mm, IPC Low Density)
footprint NCEP-SOT23-3_L (SOT23, 3-Leads, Body 3x1.4mm, Pitch 0.95mm, IPC High Density)
pins: 1 GATE, 2 SOURCE, 3 DRAIN

## CMP-013-00019-3
designator Q?, comment SSM3J328R,LF
TOSHIBA Field-Effect Transistor Silicon P-Channel MOS Type (U-MOS?), 20 V, -55 to 125 degC, 3-Pin SOTFL, RoHS, Tape and Reel; Input Capacitance: 840pF; Capacitance: -23f; Rds On Max: 29.8mohm; Package Description: 3-Pin Small Outline Transistor, Flat Lead, Body 2.9 x 1.8 mm, Pitch 0.95 mm; Case/Package: SOT-23-3; Package Reference: SOT-23F; RoHS Compliant: True; Manufacturer: Toshiba; Max Operating Temperature: 150°C; Pins: 3; Package Quantity: 1; Datasheet URL: https://toshiba.semicon-storage.com/info/docget.jsp?did=2429&prodName=SSM3J328R; Packaging: CutTape; Datasheet Version: Mar-14; Mounting Technology: SM; Min Operating Temperature: -55°C
footprint TOSH-SOT-23F_V (SOTFL, 3-Leads, Body 3.1x1.9mm, Pitch 0.95mm)
pins: 1 G, 2 S, 3 D

## CMP-013-00020-4
designator Q?, comment 2N7000
Small Signal MOSFET, 200 mA, 60 V, N-Channel, 3-Pin TO-92, Bulk Box; Manufacturer: Fairchild Semiconductor; Input Capacitance: 50pF; Power: 400mW; Rds On Max: 5Ohm; Nominal Dual Supply Voltage: 60V; Elements: 1; Package Version: Rev. AM; Nominal Vgs: 2.1V; RoHS Compliant: True; Mounting Technology: TH; Max Operating Temperature: 150°C; Package Quantity: 2000; Package Reference: TO-92-3-29-11_AM_BL; Datasheet Version: Rev. 8, 04/2011; Package Description: 3-Pin Transistor Outline, Body 4.825 x 3.685 mm, Pitch 1.27 mm; Packaging: Bulk; Min Operating Temperature: -55°C; Case/Package: TO-92; Datasheet URL: http://www.onsemi.com/pub_link/Collateral/2N7000-D.PDF; Pins: 3
footprint ONSC-TO-92-3-29-11_AM_BL (TO, 3-Leads, Body Dia 4.7mm, Pitch 2.6mm)
pins: 1 S, 2 G, 3 D

## CMP-013-00021-4
designator Q?, comment BSS138
N-Channel Logic Level Enhancement Mode Field Effect Transistor, 220 mA, 50 V, -55 to 150 degC, 3-Pin SOT-23, RoHS, Tape and Reel; Manufacturer: Fairchild; Elements: 1; Nominal Vgs: 1.3V; Resistance: 0.7Ohm; Typical Rise Time: 9ns; Rds On Max: 3.5Ohm; Nominal Dual Supply Voltage: 50V; Input Capacitance: 27pF; Package Version: Rev. 12, 03/2016; Power: 360mW; Packaging: TapeandReel; Package Description: 3-Pin Small Outline Transistor, Body 2.92 x 1.325 mm, Pitch 0.95 mm; Datasheet URL: https://www.fairchildsemi.com/datasheets/BS/BSS138.pdf; Min Operating Temperature: -55°C; Pins: 3; RoHS Compliant: True; Package Reference: SOT23-3; Package Quantity: 1; Case/Package: TO-236-3; Mounting Technology: SM; Max Operating Temperature: 150°C; Datasheet Version: Rev. C, 10/2005
footprint FAIR-SOT23-3_V (SOT23, 3-Leads, Body 3.12x1.5mm, Pitch 0.95mm)
pins: 1 G, 2 S, 3 D

## CMP-013-00022-4
designator Q?, comment BSS84
P-Channel Enhancement Mode Field-Effect Transistor, 0.13 A, 50 V, -55 to 150 degC, 3-Pin SOT23, RoHS, Tape and Reel; Manufacturer: Fairchild; Nominal Vgs: -1.7V; Typical Rise Time: 6.3ns; Input Capacitance: 73pF; Rds On Max: 10Ohm; Elements: 1; Package Version: Rev. 12, 03/2016; Nominal Dual Supply Voltage: -50V; Power: 360mW; Package Quantity: 3000; Mounting Technology: SM; Package Reference: SOT23-3; Case/Package: TO-236-3; Package Description: 3-Pin Small Outline Transistor, Body 2.92 x 1.325 mm, Pitch 0.95 mm; Datasheet URL: https://www.fairchildsemi.com/datasheets/BS/BSS84.pdf; Packaging: TapeandReel; Max Operating Temperature: 150°C; Min Operating Temperature: -55°C; Pins: 3; Datasheet Version: Rev. 1.1.0, 02/2013; RoHS Compliant: True
footprint FAIR-SOT23-3_V (SOT23, 3-Leads, Body 3.12x1.5mm, Pitch 0.95mm)
pins: 1 GATE, 2 SOURCE, 3 DRAIN

## CMP-013-00023-3
designator Q?, comment FQD13N06LTM
N-Channel QFET(R) MOSFET, 11 A, 60 V, 115 mOhm, -55 to 150 degC, 3-Pin DPAK (TO-252), RoHS, Tape and Reel; Manufacturer: Fairchild; Power: 2.5W; Elements: 1; Typical Rise Time: 90ns; Package Version: Rev. 11, 05/2016; Input Capacitance: 350pF; Packaging: TapeandReel; Package Quantity: 2500; Mounting Technology: SM; Pins: 3; Max Operating Temperature: 150°C; Package Reference: TO-252; Case/Package: TO-252-3; Datasheet Version: Rev. 1.7, 07/2016; RoHS Compliant: True; Rds On Max: 115mohm; Package Description: 3-Pin Transistor Outline, Body 6.54 x 6.095 mm, Pitch 2.28 mm; Datasheet URL: https://www.fairchildsemi.com/datasheets/FQ/FQD13N06L.pdf; Min Operating Temperature: -55°C
footprint FAIR-TO-252-3_V (D-PAK, 3-Leads, Body 6.22x6.73mm, Pitch 2.28mm)
pins: 1 G, 3 S, 4 D

## CMP-013-00024-3
designator Q?, comment FQU13N06LTU
N-Channel QFET(R) MOSFET, 11 A, 60 V, 115 mOhm, -55 to 150 degC, 3-Pin TO-251, RoHS, Tube; Manufacturer: Fairchild; Input Capacitance: 350pF; Typical Rise Time: 90ns; Elements: 1; Power: 2.5W; Package Quantity: 70; Case/Package: TO-251-3; Max Operating Temperature: 150°C; Rds On Max: 115mohm; Pins: 3; Datasheet Version: Rev. 1.7, 07/2016; Mounting Technology: TH; RoHS Compliant: True; Min Operating Temperature: -55°C; Package Reference: TO-251-3; Datasheet URL: https://www.fairchildsemi.com/datasheets/FQ/FQU13N06L.pdf; Packaging: Rail/Tube; Package Description: 3-Pin Flange Mount, Body 6.575 x 2.3 mm, Pitch 2.29 mm
footprint FAIR-TO-251-3 (FM, 3-Leads, Body 6.8x2.5mm, Pitch 2.29mm)
pins: 1 G, 2 D, 3 S

## CMP-013-00025-4
designator Q?, comment ZVP3306A
P-Channel Enhancement Mode Vertical DMOS FET, 60 VDS, 3-Pin TO92, RoHS, Bulk; Manufacturer: Diodes Inc; Elements: 1; Nominal Dual Supply Voltage: -60V; Input Capacitance: 50pF; Nominal Vgs: -3.5V; Power: 625mW; Typical Rise Time: 8ns; Rds On Max: 14Ohm; RoHS Compliant: True; Case/Package: TO-226-3; Pins: 3; Datasheet URL: http://www.diodes.com/_files/datasheets/ZVP3306A.pdf; Package Quantity: 4000; Package Description: 3-Pin Transistor Outline Package, Body Dia 4.57 mm, Pitch 1.27 mm; Datasheet Version: Rev. 2, 03/1994; Package Reference: TO92-3; Min Operating Temperature: -55°C; Mounting Technology: TH; Max Operating Temperature: 150°C; Packaging: Bulk
footprint DIOD-TO92-3 (TO, 3-Leads, Body Dia 4.57mm, Pitch 1.27mm)
pins: 1 S, 2 G, 3 D

## CMP-013-00026-2
designator Q?, comment RUM002N05T2L
Nch Small Signal MOSFET, 50 V, 200 mA, 3-Pin SOT723, RoHS, Tape and Reel; Vgs(th) (Max) @ Id: 1V@1mA; Pins: 3
footprint ROHM-SOT723-3_V (SOT723, 3-Leads, Body 1.2x0.8mm, Pitch 0.8mm)
footprint ROHM-SOT723-3_V (SOT723, 3-Leads, Body 1.2x0.8mm, Pitch 0.8mm)
pins: 1 G, 2 S, 3 D

## CMP-013-00027-2
designator Q?, comment RZM002P02T2L
Pch Small Signal MOSFET, 20 V, 200 mA, 3-Pin SOT723, RoHS, Tape and Reel; Vgs(th) (Max) @ Id: 1V@100µA; Pins: 3
footprint ROHM-SOT723-3_V (SOT723, 3-Leads, Body 1.2x0.8mm, Pitch 0.8mm)
footprint ROHM-SOT723-3_V (SOT723, 3-Leads, Body 1.2x0.8mm, Pitch 0.8mm)
pins: 1 G, 2 S, 3 D

## CMP-013-00028-2
designator Q?, comment MMBT2222AM3T5G
NPN General Purpose Transistor, 3-Pin SOT-723, Pb-Free, Tape and Reel; ComponentLink3Description: Package Specification; ComponentLink1URL: http://www.onsemi.com/; ComponentLink3URL: http://www.onsemi.com/pub_link/Collateral/631AA.PDF; ComponentLink2Description: Datasheet; Mounting Technology: SMT; Pins: 3; Case/Package: SOT-723; RoHS Compliant: TRUE; ComponentLink1Description: Manufacturer URL; ComponentLink2URL: http://www.onsemi.cn/pub_link/Collateral/MMBT2222AM3-D.PDF
footprint ROHM-SOT723-3_V (SOT723, 3-Leads, Body 1.2x0.8mm, Pitch 0.8mm)
footprint ROHM-SOT723-3_V (SOT723, 3-Leads, Body 1.2x0.8mm, Pitch 0.8mm)
pins: 1 B, 2 E, 3 C

## CMP-013-00029-2
designator Q?, comment PSMN1R0-30YLDX
N-channel Logic Level MOSFET, 30 V, 300 A, -55 to 175 degC, 5-Pin SOT669, RoHS, Tape and Reel; Vgs (Max): 20V; Transistor Type: 1N-Channel; RoHS Compliant: True; Pins: 5
footprint NXP-SOT669_L (DPAK, 4-Leads, Body 5x4.1mm, Pitch 1.27mm, IPC High Density)
footprint NXP-SOT669_L (DPAK, 4-Leads, Body 5x4.1mm, Pitch 1.27mm, IPC High Density)
pins: 1 S, 2 S, 3 S, 4 G, 5 D

## CMP-013-00030-2
designator Q?, comment SISS27DN
P-Channel (D-S) MOSFET, 30 V, 50 A, -50 to 150 degC, 8-Pin PowerPAK1212, RoHS, Tape and Reel; Vgs(th) (Max) @ Id: 2.2V@250µA; Pins: 8
footprint VISH-PPAK1212-8_V (SMD, 8-Leads, Body 3.21x3.21mm, Pitch 0.66mm)
footprint VISH-PPAK1212-8_V (SMD, 8-Leads, Body 3.21x3.21mm, Pitch 0.66mm)
pins: 1 S, 2 S, 3 S, 4 G, 5 D, 6 D, 7 D, 8 D

## CMP-013-00031-2
designator Q?, comment DTC114EM3T5G
Digital Transistor (BRT), R1=10 kOhm, R2=10 kOhm, NPN Transistor, 3-Pin SOT-723, Pb-Free, Tape and Reel; ComponentLink3URL: http://www.onsemi.com/pub_link/Collateral/631AA.PDF; Pins: 3; ComponentLink2URL: http://www.onsemi.cn/pub_link/Collateral/DTC114E-D.PDF; ComponentLink3Description: Package Specification; ComponentLink1URL: http://www.onsemi.com/; RoHS Compliant: TRUE; ComponentLink1Description: Manufacturer URL; Mounting Technology: SMT; Case/Package: SOT-723; ComponentLink2Description: Datasheet
footprint ROHM-SOT723-3_V (SOT723, 3-Leads, Body 1.2x0.8mm, Pitch 0.8mm)
footprint ROHM-SOT723-3_V (SOT723, 3-Leads, Body 1.2x0.8mm, Pitch 0.8mm)
pins: 1 B, 2 E, 3 C
